# Altium schematic symbol library Capacitor - Aluminium TH.SchLib: 4591 symbols (part 11 of 27)
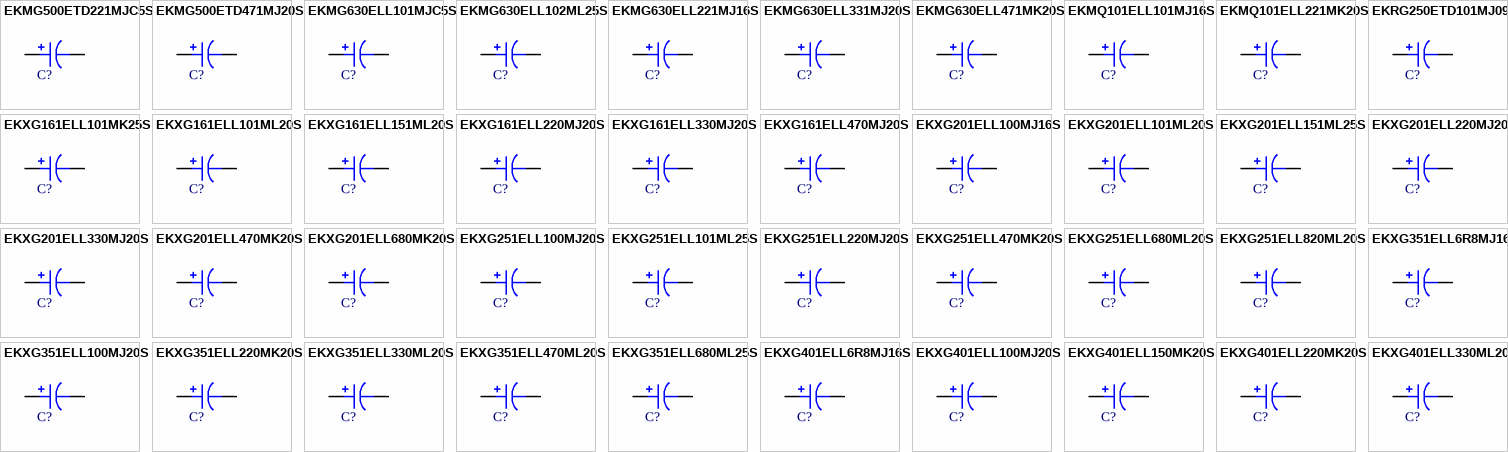
[diagram p124: symbols EKMG500ETD221MJC5S to EKXG401ELL330ML20S]

## EKXG351ELL100MJ20S
designator C?, comment 10uF  (value not drawn)
CAP ALUM 10UF 20% 350V RADIAL; Part Number: EKXG351ELL100MJ20S; Manufacturer: United Chemi-Con; TemperatureRange: -40C ~ 105C; Type: Polar; Ripple Current: 140mA @ 120Hz; Value: 10uF; PartId: 25682; Supplier 1: Digi-Key; Supplier Part Number 1: 565-1450-ND; ComponentLink1Description: Datasheet; ComponentLink1URL: http://www.chemi-con.co.jp/cgi-bin/CAT_DB/SEARCH/cat_db_al.cgi?e=e&j=p&pdfname=kxg; ComponentLink2Description: Digi-Key Listing; ComponentLink2URL: https://www.digikey.com/product-detail/en/united-chemi-con/EKXG351ELL100MJ20S/565-1450-ND/755966; Tolerance: 20%; Voltage: 350V; Price: 0.8; Device Package: Radial, Can, 10mm
footprint CAP AL TH D10 L5 H22
pins: 1, 2

## EKXG351ELL220MK20S
designator C?, comment 22uF  (value not drawn)
CAP ALUM 22UF 20% 350V RADIAL; Part Number: EKXG351ELL220MK20S; Manufacturer: United Chemi-Con; TemperatureRange: -40C ~ 105C; Type: Polar; Ripple Current: 260mA @ 120Hz; Value: 22uF; PartId: 22938; Supplier 1: Digi-Key; Supplier Part Number 1: 565-1451-ND; ComponentLink1Description: Datasheet; ComponentLink1URL: http://www.chemi-con.co.jp/cgi-bin/CAT_DB/SEARCH/cat_db_al.cgi?e=e&j=p&pdfname=kxg; ComponentLink2Description: Digi-Key Listing; ComponentLink2URL: https://www.digikey.com/product-detail/en/united-chemi-con/EKXG351ELL220MK20S/565-1451-ND/755967; Tolerance: 20%; Voltage: 350V; Price: 0; Device Package: Radial, Can, 12.5mm
footprint CAP AL TH D12.5 L5 H20
pins: 1, 2

## EKXG351ELL330ML20S
designator C?, comment 33uF  (value not drawn)
CAP ALUM 33UF 20% 350V RADIAL; Part Number: EKXG351ELL330ML20S; Manufacturer: United Chemi-Con; TemperatureRange: -40C ~ 105C; Type: Polar; Ripple Current: 360mA @ 120Hz; Value: 33uF; PartId: 26344; Supplier 1: Digi-Key; Supplier Part Number 1: 565-1452-ND; ComponentLink1Description: Datasheet; ComponentLink1URL: http://www.chemi-con.co.jp/cgi-bin/CAT_DB/SEARCH/cat_db_al.cgi?e=e&j=p&pdfname=kxg; ComponentLink2Description: Digi-Key Listing; ComponentLink2URL: https://www.digikey.com/product-detail/en/united-chemi-con/EKXG351ELL330ML20S/565-1452-ND/755968; Tolerance: 20%; Voltage: 350V; Price: 1.66; Device Package: Radial, Can, 16mm
footprint CAP AL TH D16 L7.5 H20
pins: 1, 2

## EKXG351ELL470ML20S
designator C?, comment 47uF  (value not drawn)
CAP ALUM 47UF 20% 350V RADIAL; Part Number: EKXG351ELL470ML20S; Manufacturer: United Chemi-Con; TemperatureRange: -40C ~ 105C; Type: Polar; Ripple Current: 430mA @ 120Hz; Value: 47uF; PartId: 26346; Supplier 1: Digi-Key; Supplier Part Number 1: 565-1453-ND; ComponentLink1Description: Datasheet; ComponentLink1URL: http://www.chemi-con.co.jp/cgi-bin/CAT_DB/SEARCH/cat_db_al.cgi?e=e&j=p&pdfname=kxg; ComponentLink2Description: Digi-Key Listing; ComponentLink2URL: https://www.digikey.com/product-detail/en/united-chemi-con/EKXG351ELL470ML20S/565-1453-ND/755969; Tolerance: 20%; Voltage: 350V; Price: 1.78; Device Package: Radial, Can, 16mm
footprint CAP AL TH D16 L7.5 H20
pins: 1, 2

## EKXG351ELL680ML25S
designator C?, comment 68uF  (value not drawn)
CAP ALUM 68UF 20% 350V RADIAL; Part Number: EKXG351ELL680ML25S; Manufacturer: United Chemi-Con; TemperatureRange: -40C ~ 105C; Type: Polar; Ripple Current: 560mA @ 120Hz; Value: 68uF; PartId: 26700; Supplier 1: Digi-Key; Supplier Part Number 1: 565-1454-ND; ComponentLink1Description: Datasheet; ComponentLink1URL: http://www.chemi-con.co.jp/cgi-bin/CAT_DB/SEARCH/cat_db_al.cgi?e=e&j=p&pdfname=kxg; ComponentLink2Description: Digi-Key Listing; ComponentLink2URL: https://www.digikey.com/product-detail/en/united-chemi-con/EKXG351ELL680ML25S/565-1454-ND/755970; Tolerance: 20%; Voltage: 350V; Price: 1.97; Device Package: Radial, Can, 16mm
footprint CAP AL TH D16 L7.5 H26.5
pins: 1, 2

## EKXG401ELL6R8MJ16S
designator C?, comment 6.8uF  (value not drawn)
CAP ALUM 6.8UF 20% 400V RADIAL; Part Number: EKXG401ELL6R8MJ16S; Manufacturer: United Chemi-Con; TemperatureRange: -40C ~ 105C; Type: Polar; Ripple Current: 110mA @ 120Hz; Value: 6.8uF; PartId: 25360; Supplier 1: Digi-Key; Supplier Part Number 1: 565-1460-ND; ComponentLink1Description: Datasheet; ComponentLink1URL: http://www.chemi-con.co.jp/cgi-bin/CAT_DB/SEARCH/cat_db_al.cgi?e=e&j=p&pdfname=kxg; ComponentLink2Description: Digi-Key Listing; ComponentLink2URL: https://www.digikey.com/product-detail/en/united-chemi-con/EKXG401ELL6R8MJ16S/565-1460-ND/755976; Tolerance: 20%; Voltage: 400V; Price: 0.71; Device Package: Radial, Can, 10mm
footprint CAP AL TH D10 L5 H17.5
pins: 1, 2

## EKXG401ELL100MJ20S
designator C?, comment 10uF  (value not drawn)
CAP ALUM 10UF 20% 400V RADIAL; Part Number: EKXG401ELL100MJ20S; Manufacturer: United Chemi-Con; TemperatureRange: -40C ~ 105C; Type: Polar; Ripple Current: 140mA @ 120Hz; Value: 10uF; PartId: 25695; Supplier 1: Digi-Key; Supplier Part Number 1: 565-1461-ND; ComponentLink1Description: Datasheet; ComponentLink1URL: http://www.chemi-con.co.jp/cgi-bin/CAT_DB/SEARCH/cat_db_al.cgi?e=e&j=p&pdfname=kxg; ComponentLink2Description: Digi-Key Listing; ComponentLink2URL: https://www.digikey.com/product-detail/en/united-chemi-con/EKXG401ELL100MJ20S/565-1461-ND/755977; Tolerance: 20%; Voltage: 400V; Price: 0.83; Device Package: Radial, Can, 10mm
footprint CAP AL TH D10 L5 H22
pins: 1, 2

## EKXG401ELL150MK20S
designator C?, comment 15uF  (value not drawn)
CAP ALUM 15UF 20% 400V RADIAL; Part Number: EKXG401ELL150MK20S; Manufacturer: United Chemi-Con; TemperatureRange: -40C ~ 105C; Type: Polar; Ripple Current: 220mA @ 120Hz; Value: 15uF; PartId: 22941; Supplier 1: Digi-Key; Supplier Part Number 1: 565-1462-ND; ComponentLink1Description: Datasheet; ComponentLink1URL: http://www.chemi-con.co.jp/cgi-bin/CAT_DB/SEARCH/cat_db_al.cgi?e=e&j=p&pdfname=kxg; ComponentLink2Description: Digi-Key Listing; ComponentLink2URL: https://www.digikey.com/product-detail/en/united-chemi-con/EKXG401ELL150MK20S/565-1462-ND/755978; Tolerance: 20%; Voltage: 400V; Price: 0; Device Package: Radial, Can, 12.5mm
footprint CAP AL TH D12.5 L5 H20
pins: 1, 2

## EKXG401ELL220MK20S
designator C?, comment 22uF  (value not drawn)
CAP ALUM 22UF 20% 400V RADIAL; Part Number: EKXG401ELL220MK20S; Manufacturer: United Chemi-Con; TemperatureRange: -40C ~ 105C; Type: Polar; Ripple Current: 260mA @ 120Hz; Value: 22uF; PartId: 22940; Supplier 1: Digi-Key; Supplier Part Number 1: 565-1463-ND; ComponentLink1Description: Datasheet; ComponentLink1URL: http://www.chemi-con.co.jp/cgi-bin/CAT_DB/SEARCH/cat_db_al.cgi?e=e&j=p&pdfname=kxg; ComponentLink2Description: Digi-Key Listing; ComponentLink2URL: https://www.digikey.com/product-detail/en/united-chemi-con/EKXG401ELL220MK20S/565-1463-ND/755979; Tolerance: 20%; Voltage: 400V; Price: 0; Device Package: Radial, Can, 12.5mm
footprint CAP AL TH D12.5 L5 H20
pins: 1, 2

## EKXG401ELL330ML20S
designator C?, comment 33uF  (value not drawn)
CAP ALUM 33UF 20% 400V RADIAL; Part Number: EKXG401ELL330ML20S; Manufacturer: United Chemi-Con; TemperatureRange: -40C ~ 105C; Type: Polar; Ripple Current: 360mA @ 120Hz; Value: 33uF; PartId: 26341; Supplier 1: Digi-Key; Supplier Part Number 1: 565-1464-ND; ComponentLink1Description: Datasheet; ComponentLink1URL: http://www.chemi-con.co.jp/cgi-bin/CAT_DB/SEARCH/cat_db_al.cgi?e=e&j=p&pdfname=kxg; ComponentLink2Description: Digi-Key Listing; ComponentLink2URL: https://www.digikey.com/product-detail/en/united-chemi-con/EKXG401ELL330ML20S/565-1464-ND/755980; Tolerance: 20%; Voltage: 400V; Price: 1.62; Device Package: Radial, Can, 16mm
footprint CAP AL TH D16 L7.5 H20
pins: 1, 2

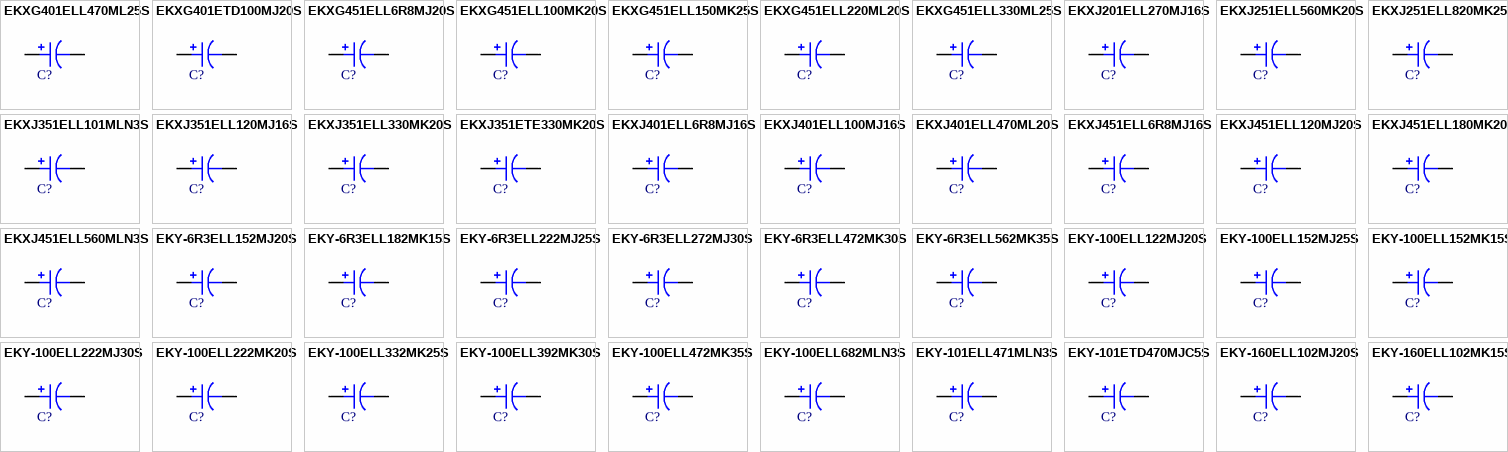
[diagram p43: symbols EKXG401ELL470ML25S to EKY-160ELL102MK15S]

## EKXG401ELL470ML25S
designator C?, comment 47uF  (value not drawn)
CAP ALUM 47UF 20% 400V RADIAL; Part Number: EKXG401ELL470ML25S; Manufacturer: United Chemi-Con; TemperatureRange: -40C ~ 105C; Type: Polar; Ripple Current: 470mA @ 120Hz; Value: 47uF; PartId: 26699; Supplier 1: Digi-Key; Supplier Part Number 1: 565-1465-ND; ComponentLink1Description: Datasheet; ComponentLink1URL: http://www.chemi-con.co.jp/cgi-bin/CAT_DB/SEARCH/cat_db_al.cgi?e=e&j=p&pdfname=kxg; ComponentLink2Description: Digi-Key Listing; ComponentLink2URL: https://www.digikey.com/product-detail/en/united-chemi-con/EKXG401ELL470ML25S/565-1465-ND/755981; Tolerance: 20%; Voltage: 400V; Price: 1.96; Device Package: Radial, Can, 16mm
footprint CAP AL TH D16 L7.5 H26.5
pins: 1, 2

## EKXG401ETD100MJ20S
designator C?, comment 10uF  (value not drawn)
CAP ALUM 10UF 20% 400V RADIAL; Part Number: EKXG401ETD100MJ20S; Manufacturer: United Chemi-Con; TemperatureRange: -40C ~ 105C; Type: Polar; Ripple Current: 140mA @ 120Hz; Value: 10uF; PartId: 25471; Supplier 1: Digi-Key; Supplier Part Number 1: 565-4257-3-ND; ComponentLink1Description: Datasheet; ComponentLink1URL: http://www.chemi-con.co.jp/cgi-bin/CAT_DB/SEARCH/cat_db_al.cgi?e=e&j=p&pdfname=kxg; ComponentLink2Description: Digi-Key Listing; ComponentLink2URL: https://www.digikey.com/product-detail/en/united-chemi-con/EKXG401ETD100MJ20S/565-4257-3-ND/4001214; Tolerance: 20%; Voltage: 400V; Price: 0.2907; Device Package: Radial, Can, 10mm
footprint CAP AL TH D10 L5 H22
pins: 1, 2

## EKXG451ELL6R8MJ20S
designator C?, comment 6.8uF  (value not drawn)
CAP ALUM 6.8UF 20% 450V RADIAL; Part Number: EKXG451ELL6R8MJ20S; Manufacturer: United Chemi-Con; TemperatureRange: -25C ~ 105C; Type: Polar; Ripple Current: 110mA @ 120Hz; Value: 6.8uF; PartId: 25679; Supplier 1: Digi-Key; Supplier Part Number 1: 565-1472-ND; ComponentLink1Description: Datasheet; ComponentLink1URL: http://www.chemi-con.co.jp/cgi-bin/CAT_DB/SEARCH/cat_db_al.cgi?e=e&j=p&pdfname=kxg; ComponentLink2Description: Digi-Key Listing; ComponentLink2URL: https://www.digikey.com/product-detail/en/united-chemi-con/EKXG451ELL6R8MJ20S/565-1472-ND/755988; Tolerance: 20%; Voltage: 450V; Price: 0.8; Device Package: Radial, Can, 10mm
footprint CAP AL TH D10 L5 H22
pins: 1, 2

## EKXG451ELL100MK20S
designator C?, comment 10uF  (value not drawn)
CAP ALUM 10UF 20% 450V RADIAL; Part Number: EKXG451ELL100MK20S; Manufacturer: United Chemi-Con; TemperatureRange: -25C ~ 105C; Type: Polar; Ripple Current: 180mA @ 120Hz; Value: 10uF; PartId: 22939; Supplier 1: Digi-Key; Supplier Part Number 1: 565-1473-ND; ComponentLink1Description: Datasheet; ComponentLink1URL: http://www.chemi-con.co.jp/cgi-bin/CAT_DB/SEARCH/cat_db_al.cgi?e=e&j=p&pdfname=kxg; ComponentLink2Description: Digi-Key Listing; ComponentLink2URL: https://www.digikey.com/product-detail/en/united-chemi-con/EKXG451ELL100MK20S/565-1473-ND/755989; Tolerance: 20%; Voltage: 450V; Price: 0; Device Package: Radial, Can, 12.5mm
footprint CAP AL TH D12.5 L5 H20
pins: 1, 2

## EKXG451ELL150MK25S
designator C?, comment 15uF  (value not drawn)
CAP ALUM 15UF 20% 450V RADIAL; Part Number: EKXG451ELL150MK25S; Manufacturer: United Chemi-Con; TemperatureRange: -25C ~ 105C; Type: Polar; Ripple Current: 240mA @ 120Hz; Value: 15uF; PartId: 23621; Supplier 1: Digi-Key; Supplier Part Number 1: 565-1474-ND; ComponentLink1Description: Datasheet; ComponentLink1URL: http://www.chemi-con.co.jp/cgi-bin/CAT_DB/SEARCH/cat_db_al.cgi?e=e&j=p&pdfname=kxg; ComponentLink2Description: Digi-Key Listing; ComponentLink2URL: https://www.digikey.com/product-detail/en/united-chemi-con/EKXG451ELL150MK25S/565-1474-ND/755990; Tolerance: 20%; Voltage: 450V; Price: 1.45; Device Package: Radial, Can, 12.5mm
footprint CAP AL TH D12.5 L5 H25
pins: 1, 2

## EKXG451ELL220ML20S
designator C?, comment 22uF  (value not drawn)
CAP ALUM 22UF 20% 450V RADIAL; Part Number: EKXG451ELL220ML20S; Manufacturer: United Chemi-Con; TemperatureRange: -25C ~ 105C; Type: Polar; Ripple Current: 290mA @ 120Hz; Value: 22uF; PartId: 26345; Supplier 1: Digi-Key; Supplier Part Number 1: 565-1475-ND; ComponentLink1Description: Datasheet; ComponentLink1URL: http://www.chemi-con.co.jp/cgi-bin/CAT_DB/SEARCH/cat_db_al.cgi?e=e&j=p&pdfname=kxg; ComponentLink2Description: Digi-Key Listing; ComponentLink2URL: https://www.digikey.com/product-detail/en/united-chemi-con/EKXG451ELL220ML20S/565-1475-ND/755991; Tolerance: 20%; Voltage: 450V; Price: 1.75; Device Package: Radial, Can, 16mm
footprint CAP AL TH D16 L7.5 H20
pins: 1, 2

## EKXG451ELL330ML25S
designator C?, comment 33uF  (value not drawn)
CAP ALUM 33UF 20% 450V RADIAL; Part Number: EKXG451ELL330ML25S; Manufacturer: United Chemi-Con; TemperatureRange: -25C ~ 105C; Type: Polar; Ripple Current: 390mA @ 120Hz; Value: 33uF; PartId: 26704; Supplier 1: Digi-Key; Supplier Part Number 1: 565-1476-ND; ComponentLink1Description: Datasheet; ComponentLink1URL: http://www.chemi-con.co.jp/cgi-bin/CAT_DB/SEARCH/cat_db_al.cgi?e=e&j=p&pdfname=kxg; ComponentLink2Description: Digi-Key Listing; ComponentLink2URL: https://www.digikey.com/product-detail/en/united-chemi-con/EKXG451ELL330ML25S/565-1476-ND/755992; Tolerance: 20%; Voltage: 450V; Price: 2.19; Device Package: Radial, Can, 16mm
footprint CAP AL TH D16 L7.5 H26.5
pins: 1, 2

## EKXJ201ELL270MJ16S
designator C?, comment 27uF  (value not drawn)
CAP ALUM 27UF 20% 200V RADIAL; Part Number: EKXJ201ELL270MJ16S; Manufacturer: United Chemi-Con; TemperatureRange: -40C ~ 105C; Type: Polar; Ripple Current: 200mA @ 120Hz; Value: 27uF; PartId: 25395; Supplier 1: Digi-Key; Supplier Part Number 1: 565-4217-ND; ComponentLink1Description: Datasheet; ComponentLink1URL: http://www.chemi-con.co.jp/cgi-bin/CAT_DB/SEARCH/cat_db_al.cgi?e=e&j=p&pdfname=kxj; ComponentLink2Description: Digi-Key Listing; ComponentLink2URL: https://www.digikey.com/product-detail/en/united-chemi-con/EKXJ201ELL270MJ16S/565-4217-ND/4001231; Tolerance: 20%; Voltage: 200V; Price: 0.79; Device Package: Radial, Can, 10mm
footprint CAP AL TH D10 L5 H17.5
pins: 1, 2

## EKXJ251ELL560MK20S
designator C?, comment 56uF  (value not drawn)
CAP ALUM 56UF 20% 250V RADIAL; Part Number: EKXJ251ELL560MK20S; Manufacturer: United Chemi-Con; TemperatureRange: -40C ~ 105C; Type: Polar; Ripple Current: 430mA @ 120Hz; Value: 56uF; PartId: 23042; Supplier 1: Digi-Key; Supplier Part Number 1: 565-3497-ND; ComponentLink1Description: Datasheet; ComponentLink1URL: http://www.chemi-con.co.jp/cgi-bin/CAT_DB/SEARCH/cat_db_al.cgi?e=e&j=p&pdfname=kxj; ComponentLink2Description: Digi-Key Listing; ComponentLink2URL: https://www.digikey.com/product-detail/en/united-chemi-con/EKXJ251ELL560MK20S/565-3497-ND/3529014; Tolerance: 20%; Voltage: 250V; Price: 0; Device Package: Radial, Can, 12.5mm
footprint CAP AL TH D12.5 L5 H21.5
pins: 1, 2

## EKXJ251ELL820MK25S
designator C?, comment 82uF  (value not drawn)
CAP ALUM 82UF 20% 250V RADIAL; Part Number: EKXJ251ELL820MK25S; Manufacturer: United Chemi-Con; TemperatureRange: -40C ~ 105C; Type: Polar; Ripple Current: 565mA @ 120Hz; Value: 82uF; PartId: 23735; Supplier 1: Digi-Key; Supplier Part Number 1: 565-3498-ND; ComponentLink1Description: Datasheet; ComponentLink1URL: http://www.chemi-con.co.jp/cgi-bin/CAT_DB/SEARCH/cat_db_al.cgi?e=e&j=p&pdfname=kxj; ComponentLink2Description: Digi-Key Listing; ComponentLink2URL: https://www.digikey.com/product-detail/en/united-chemi-con/EKXJ251ELL820MK25S/565-3498-ND/3529020; Tolerance: 20%; Voltage: 250V; Price: 1.5; Device Package: Radial, Can, 12.5mm
footprint CAP AL TH D12.5 L5 H26.5
pins: 1, 2

## EKXJ351ELL101MLN3S
designator C?, comment 100uF  (value not drawn)
CAP ALUM 100UF 20% 350V RADIAL; Part Number: EKXJ351ELL101MLN3S; Manufacturer: United Chemi-Con; TemperatureRange: -40C ~ 105C; Type: Polar; Ripple Current: 740mA @ 120Hz; Value: 100uF; PartId: 27262; Supplier 1: Digi-Key; Supplier Part Number 1: 565-3509-ND; ComponentLink1Description: Datasheet; ComponentLink1URL: http://www.chemi-con.co.jp/cgi-bin/CAT_DB/SEARCH/cat_db_al.cgi?e=e&j=p&pdfname=kxj; ComponentLink2Description: Digi-Key Listing; ComponentLink2URL: https://www.digikey.com/product-detail/en/united-chemi-con/EKXJ351ELL101MLN3S/565-3509-ND/3529022; Tolerance: 20%; Voltage: 350V; Price: 2.86; Device Package: Radial, Can, 16mm
footprint CAP AL TH D16 L7.5 H33.5
pins: 1, 2

## EKXJ351ELL120MJ16S
designator C?, comment 12uF  (value not drawn)
CAP ALUM 12UF 20% 350V RADIAL; Part Number: EKXJ351ELL120MJ16S; Manufacturer: United Chemi-Con; TemperatureRange: -40C ~ 105C; Type: Polar; Ripple Current: 135mA @ 120Hz; Value: 12uF; PartId: 25396; Supplier 1: Digi-Key; Supplier Part Number 1: 565-3506-ND; ComponentLink1Description: Datasheet; ComponentLink1URL: http://www.chemi-con.co.jp/cgi-bin/CAT_DB/SEARCH/cat_db_al.cgi?e=e&j=p&pdfname=kxj; ComponentLink2Description: Digi-Key Listing; ComponentLink2URL: https://www.digikey.com/product-detail/en/united-chemi-con/EKXJ351ELL120MJ16S/565-3506-ND/3529024; Tolerance: 20%; Voltage: 350V; Price: 0.79; Device Package: Radial, Can, 10mm
footprint CAP AL TH D10 L5 H17.5
pins: 1, 2

## EKXJ351ELL330MK20S
designator C?, comment 33uF  (value not drawn)
CAP ALUM 33UF 20% 350V RADIAL; Part Number: EKXJ351ELL330MK20S; Manufacturer: United Chemi-Con; TemperatureRange: -40C ~ 105C; Type: Polar; Ripple Current: 330mA @ 120Hz; Value: 33uF; PartId: 23049; Supplier 1: Digi-Key; Supplier Part Number 1: 565-4220-ND; ComponentLink1Description: Datasheet; ComponentLink1URL: http://www.chemi-con.co.jp/cgi-bin/CAT_DB/SEARCH/cat_db_al.cgi?e=e&j=p&pdfname=kxj; ComponentLink2Description: Digi-Key Listing; ComponentLink2URL: https://www.digikey.com/product-detail/en/united-chemi-con/EKXJ351ELL330MK20S/565-4220-ND/4001256; Tolerance: 20%; Voltage: 350V; Price: 0; Device Package: Radial, Can, 12.5mm
footprint CAP AL TH D12.5 L5 H21.5
pins: 1, 2

## EKXJ351ETE330MK20S
designator C?, comment 33uF  (value not drawn)
CAP ALUM 33UF 20% 350V RADIAL; Part Number: EKXJ351ETE330MK20S; Manufacturer: United Chemi-Con; TemperatureRange: -40C ~ 105C; Type: Polar; Ripple Current: 330mA @ 120Hz; Value: 33uF; PartId: 23058; Supplier 1: Digi-Key; Supplier Part Number 1: 565-3345-1-ND; ComponentLink1Description: Datasheet; ComponentLink1URL: http://www.chemi-con.co.jp/cgi-bin/CAT_DB/SEARCH/cat_db_al.cgi?e=e&j=p&pdfname=kxj; ComponentLink2Description: Digi-Key Listing; ComponentLink2URL: https://www.digikey.com/product-detail/en/united-chemi-con/EKXJ351ETE330MK20S/565-3345-1-ND/3504608; Tolerance: 20%; Voltage: 350V; Price: 0; Device Package: Radial, Can, 12.5mm
footprint CAP AL TH D12.5 L5 H21.5
pins: 1, 2

## EKXJ401ELL6R8MJ16S
designator C?, comment 6.8uF  (value not drawn)
CAP ALUM 6.8UF 20% 400V RADIAL; Part Number: EKXJ401ELL6R8MJ16S; Manufacturer: United Chemi-Con; TemperatureRange: -40C ~ 105C; Type: Polar; Value: 6.8uF; PartId: 25392; Supplier 1: Digi-Key; Supplier Part Number 1: 565-3517-ND; ComponentLink1Description: Datasheet; ComponentLink1URL: http://www.chemi-con.co.jp/cgi-bin/CAT_DB/SEARCH/cat_db_al.cgi?e=e&j=p&pdfname=kxj; ComponentLink2Description: Digi-Key Listing; ComponentLink2URL: https://www.digikey.com/product-detail/en/united-chemi-con/EKXJ401ELL6R8MJ16S/565-3517-ND/3529073; Tolerance: 20%; Voltage: 400V; Price: 0.78; Device Package: Radial, Can, 10mm
footprint CAP AL TH D10 L5 H17.5
pins: 1, 2

## EKXJ401ELL100MJ16S
designator C?, comment 10uF  (value not drawn)
CAP ALUM 10UF 20% 400V RADIAL; Part Number: EKXJ401ELL100MJ16S; Manufacturer: United Chemi-Con; TemperatureRange: -40C ~ 105C; Type: Polar; Ripple Current: 125mA @ 120Hz; Value: 10uF; PartId: 25407; Supplier 1: Digi-Key; Supplier Part Number 1: 565-4221-ND; ComponentLink1Description: Datasheet; ComponentLink1URL: http://www.chemi-con.co.jp/cgi-bin/CAT_DB/SEARCH/cat_db_al.cgi?e=e&j=p&pdfname=kxj; ComponentLink2Description: Digi-Key Listing; ComponentLink2URL: https://www.digikey.com/product-detail/en/united-chemi-con/EKXJ401ELL100MJ16S/565-4221-ND/4001263; Tolerance: 20%; Voltage: 400V; Price: 0.83; Device Package: Radial, Can, 10mm
footprint CAP AL TH D10 L5 H17.5
pins: 1, 2

## EKXJ401ELL470ML20S
designator C?, comment 47uF  (value not drawn)
CAP ALUM 47UF 20% 400V RADIAL; Part Number: EKXJ401ELL470ML20S; Manufacturer: United Chemi-Con; TemperatureRange: -40C ~ 105C; Type: Polar; Ripple Current: 435mA @ 120Hz; Value: 47uF; PartId: 26492; Supplier 1: Digi-Key; Supplier Part Number 1: 565-3521-ND; ComponentLink1Description: Datasheet; ComponentLink1URL: http://www.chemi-con.co.jp/cgi-bin/CAT_DB/SEARCH/cat_db_al.cgi?e=e&j=p&pdfname=kxj; ComponentLink2Description: Digi-Key Listing; ComponentLink2URL: https://www.digikey.com/product-detail/en/united-chemi-con/EKXJ401ELL470ML20S/565-3521-ND/3529067; Tolerance: 20%; Voltage: 400V; Price: 1.89; Device Package: Radial, Can, 16mm
footprint CAP AL TH D16 L7.5 H22
pins: 1, 2

## EKXJ451ELL6R8MJ16S
designator C?, comment 6.8uF  (value not drawn)
CAP ALUM 6.8UF 20% 450V RADIAL; Part Number: EKXJ451ELL6R8MJ16S; Manufacturer: United Chemi-Con; TemperatureRange: -25C ~ 105C; Type: Polar; Ripple Current: 105mA @ 120Hz; Value: 6.8uF; PartId: 25410; Supplier 1: Digi-Key; Supplier Part Number 1: 565-4229-ND; ComponentLink1Description: Datasheet; ComponentLink1URL: http://www.chemi-con.co.jp/cgi-bin/CAT_DB/SEARCH/cat_db_al.cgi?e=e&j=p&pdfname=kxj; ComponentLink2Description: Digi-Key Listing; ComponentLink2URL: https://www.digikey.com/product-detail/en/united-chemi-con/EKXJ451ELL6R8MJ16S/565-4229-ND/4001285; Tolerance: 20%; Voltage: 450V; Price: 0.83; Device Package: Radial, Can, 10mm
footprint CAP AL TH D10 L5 H17.5
pins: 1, 2

## EKXJ451ELL120MJ20S
designator C?, comment 12uF  (value not drawn)
CAP ALUM 12UF 20% 450V RADIAL; Part Number: EKXJ451ELL120MJ20S; Manufacturer: United Chemi-Con; TemperatureRange: -25C ~ 105C; Type: Polar; Ripple Current: 150mA @ 120Hz; Value: 12uF; PartId: 25704; Supplier 1: Digi-Key; Supplier Part Number 1: 565-4225-ND; ComponentLink1Description: Datasheet; ComponentLink1URL: http://www.chemi-con.co.jp/cgi-bin/CAT_DB/SEARCH/cat_db_al.cgi?e=e&j=p&pdfname=kxj; ComponentLink2Description: Digi-Key Listing; ComponentLink2URL: https://www.digikey.com/product-detail/en/united-chemi-con/EKXJ451ELL120MJ20S/565-4225-ND/3529113; Tolerance: 20%; Voltage: 450V; Price: 0.91; Device Package: Radial, Can, 10mm
footprint CAP AL TH D10 L5 H22
pins: 1, 2

## EKXJ451ELL180MK20S
designator C?, comment 18uF  (value not drawn)
CAP ALUM 18UF 20% 450V RADIAL; Part Number: EKXJ451ELL180MK20S; Manufacturer: United Chemi-Con; TemperatureRange: -25C ~ 105C; Type: Polar; Ripple Current: 255mA @ 120Hz; Value: 18uF; PartId: 23045; Supplier 1: Digi-Key; Supplier Part Number 1: 565-3528-ND; ComponentLink1Description: Datasheet; ComponentLink1URL: http://www.chemi-con.co.jp/cgi-bin/CAT_DB/SEARCH/cat_db_al.cgi?e=e&j=p&pdfname=kxj; ComponentLink2Description: Digi-Key Listing; ComponentLink2URL: https://www.digikey.com/product-detail/en/united-chemi-con/EKXJ451ELL180MK20S/565-3528-ND/3529116; Tolerance: 20%; Voltage: 450V; Price: 0; Device Package: Radial, Can, 12.5mm
footprint CAP AL TH D12.5 L5 H21.5
pins: 1, 2

## EKXJ451ELL560MLN3S
designator C?, comment 56uF  (value not drawn)
CAP ALUM 56UF 20% 450V RADIAL; Part Number: EKXJ451ELL560MLN3S; Manufacturer: United Chemi-Con; TemperatureRange: -25C ~ 105C; Type: Polar; Ripple Current: 585mA @ 120Hz; Value: 56uF; PartId: 27249; Supplier 1: Digi-Key; Supplier Part Number 1: 565-3538-ND; ComponentLink1Description: Datasheet; ComponentLink1URL: http://www.chemi-con.co.jp/cgi-bin/CAT_DB/SEARCH/cat_db_al.cgi?e=e&j=p&pdfname=kxj; ComponentLink2Description: Digi-Key Listing; ComponentLink2URL: https://www.digikey.com/product-detail/en/united-chemi-con/EKXJ451ELL560MLN3S/565-3538-ND/3529129; Tolerance: 20%; Voltage: 450V; Price: 2.65; Device Package: Radial, Can, 16mm
footprint CAP AL TH D16 L7.5 H33.5
pins: 1, 2

## EKY-6R3ELL152MJ20S
designator C?, comment 1500uF  (value not drawn)
CAP ALUM 1500UF 20% 6.3V RADIAL; Part Number: EKY-6R3ELL152MJ20S; Manufacturer: United Chemi-Con; TemperatureRange: -40C ~ 105C; Type: Polar; Ripple Current: 840mA @ 120Hz; Impedance: 46 mOhm; Value: 1500uF; PartId: 25515; Supplier 1: Digi-Key; Supplier Part Number 1: 565-1489-ND; ComponentLink1Description: Datasheet; ComponentLink1URL: http://www.chemi-con.co.jp/cgi-bin/CAT_DB/SEARCH/cat_db_al.cgi?e=e&j=p&pdfname=ky; ComponentLink2Description: Digi-Key Listing; ComponentLink2URL: https://www.digikey.com/product-detail/en/united-chemi-con/EKY-6R3ELL152MJ20S/565-1489-ND/756005; Tolerance: 20%; Voltage: 6.3V; Price: 0.57; Device Package: Radial, Can, 10mm
footprint CAP AL TH D10 L5 H22
pins: 1, 2

## EKY-6R3ELL182MK15S
designator C?, comment 1800uF  (value not drawn)
CAP ALUM 1800UF 20% 6.3V RADIAL; Part Number: EKY-6R3ELL182MK15S; Manufacturer: United Chemi-Con; TemperatureRange: -40C ~ 105C; Type: Polar; Ripple Current: 870mA @ 120Hz; Impedance: 49 mOhm; Value: 1800uF; PartId: 22711; Supplier 1: Digi-Key; Supplier Part Number 1: 565-1490-ND; ComponentLink1Description: Datasheet; ComponentLink1URL: http://www.chemi-con.co.jp/cgi-bin/CAT_DB/SEARCH/cat_db_al.cgi?e=e&j=p&pdfname=ky; ComponentLink2Description: Digi-Key Listing; ComponentLink2URL: https://www.digikey.com/product-detail/en/united-chemi-con/EKY-6R3ELL182MK15S/565-1490-ND/756006; Tolerance: 20%; Voltage: 6.3V; Price: 0; Device Package: Radial, Can, 12.5mm
footprint CAP AL TH D12.5 L5 H15
pins: 1, 2

## EKY-6R3ELL222MJ25S
designator C?, comment 2200uF  (value not drawn)
CAP ALUM 2200UF 20% 6.3V RADIAL; Part Number: EKY-6R3ELL222MJ25S; Manufacturer: United Chemi-Con; TemperatureRange: -40C ~ 105C; Type: Polar; Ripple Current: 1.2375A @ 120Hz; Impedance: 42 mOhm; Value: 2200uF; PartId: 26081; Supplier 1: Digi-Key; Supplier Part Number 1: 565-1491-ND; ComponentLink1Description: Datasheet; ComponentLink1URL: http://www.chemi-con.co.jp/cgi-bin/CAT_DB/SEARCH/cat_db_al.cgi?e=e&j=p&pdfname=ky; ComponentLink2Description: Digi-Key Listing; ComponentLink2URL: https://www.digikey.com/product-detail/en/united-chemi-con/EKY-6R3ELL222MJ25S/565-1491-ND/756007; Tolerance: 20%; Voltage: 6.3V; Price: 0.71; Device Package: Radial, Can, 10mm
footprint CAP AL TH D10 L5 H30
pins: 1, 2

## EKY-6R3ELL272MJ30S
designator C?, comment 2700uF  (value not drawn)
CAP ALUM 2700UF 20% 6.3V RADIAL; Part Number: EKY-6R3ELL272MJ30S; Manufacturer: United Chemi-Con; TemperatureRange: -40C ~ 105C; Type: Polar; Ripple Current: 1.4325A @ 120Hz; Impedance: 31 mOhm; Value: 2700uF; PartId: 26052; Supplier 1: Digi-Key; Supplier Part Number 1: 565-1492-ND; ComponentLink1Description: Datasheet; ComponentLink1URL: http://www.chemi-con.co.jp/cgi-bin/CAT_DB/SEARCH/cat_db_al.cgi?e=e&j=p&pdfname=ky; ComponentLink2Description: Digi-Key Listing; ComponentLink2URL: https://www.digikey.com/product-detail/en/united-chemi-con/EKY-6R3ELL272MJ30S/565-1492-ND/756008; Tolerance: 20%; Voltage: 6.3V; Price: 0.63; Device Package: Radial, Can, 10mm
footprint CAP AL TH D10 L5 H30
pins: 1, 2

## EKY-6R3ELL472MK30S
designator C?, comment 4700uF  (value not drawn)
CAP ALUM 4700UF 20% 6.3V RADIAL; Part Number: EKY-6R3ELL472MK30S; Manufacturer: United Chemi-Con; TemperatureRange: -40C ~ 105C; Type: Polar; Ripple Current: 2.2525A @ 120Hz; Impedance: 24 mOhm; Value: 4700uF; PartId: 24213; Supplier 1: Digi-Key; Supplier Part Number 1: 565-1495-ND; ComponentLink1Description: Datasheet; ComponentLink1URL: http://www.chemi-con.co.jp/cgi-bin/CAT_DB/SEARCH/cat_db_al.cgi?e=e&j=p&pdfname=ky; ComponentLink2Description: Digi-Key Listing; ComponentLink2URL: https://www.digikey.com/product-detail/en/united-chemi-con/EKY-6R3ELL472MK30S/565-1495-ND/756011; Tolerance: 20%; Voltage: 6.3V; Price: 0.95; Device Package: Radial, Can, 12.5mm
footprint CAP AL TH D12.5 L5 H35.5
pins: 1, 2

## EKY-6R3ELL562MK35S
designator C?, comment 5600uF  (value not drawn)
CAP ALUM 5600UF 20% 6.3V RADIAL; Part Number: EKY-6R3ELL562MK35S; Manufacturer: United Chemi-Con; TemperatureRange: -40C ~ 105C; Type: Polar; Ripple Current: 2.448A @ 120Hz; Impedance: 20 mOhm; Value: 5600uF; PartId: 24256; Supplier 1: Digi-Key; Supplier Part Number 1: 565-1496-ND; ComponentLink1Description: Datasheet; ComponentLink1URL: http://www.chemi-con.co.jp/cgi-bin/CAT_DB/SEARCH/cat_db_al.cgi?e=e&j=p&pdfname=ky; ComponentLink2Description: Digi-Key Listing; ComponentLink2URL: https://www.digikey.com/product-detail/en/united-chemi-con/EKY-6R3ELL562MK35S/565-1496-ND/756012; Tolerance: 20%; Voltage: 6.3V; Price: 1.03; Device Package: Radial, Can, 12.5mm
footprint CAP AL TH D12.5 L5 H35.5
pins: 1, 2

## EKY-100ELL122MJ20S
designator C?, comment 1200uF  (value not drawn)
CAP ALUM 1200UF 20% 10V RADIAL; Part Number: EKY-100ELL122MJ20S; Manufacturer: United Chemi-Con; TemperatureRange: -40C ~ 105C; Type: Polar; Ripple Current: 840mA @ 120Hz; Impedance: 46 mOhm; Value: 1200uF; PartId: 25514; Supplier 1: Digi-Key; Supplier Part Number 1: 565-1506-ND; ComponentLink1Description: Datasheet; ComponentLink1URL: http://www.chemi-con.co.jp/cgi-bin/CAT_DB/SEARCH/cat_db_al.cgi?e=e&j=p&pdfname=ky; ComponentLink2Description: Digi-Key Listing; ComponentLink2URL: https://www.digikey.com/product-detail/en/united-chemi-con/EKY-100ELL122MJ20S/565-1506-ND/756022; Tolerance: 20%; Voltage: 10V; Price: 0.56; Device Package: Radial, Can, 10mm
footprint CAP AL TH D10 L5 H22
pins: 1, 2

## EKY-100ELL152MJ25S
designator C?, comment 1500uF  (value not drawn)
CAP ALUM 1500UF 20% 10V RADIAL; Part Number: EKY-100ELL152MJ25S; Manufacturer: United Chemi-Con; TemperatureRange: -40C ~ 105C; Type: Polar; Ripple Current: 990mA @ 120Hz; Impedance: 42 mOhm; Value: 1500uF; PartId: 26070; Supplier 1: Digi-Key; Supplier Part Number 1: 565-1507-ND; ComponentLink1Description: Datasheet; ComponentLink1URL: http://www.chemi-con.co.jp/cgi-bin/CAT_DB/SEARCH/cat_db_al.cgi?e=e&j=p&pdfname=ky; ComponentLink2Description: Digi-Key Listing; ComponentLink2URL: https://www.digikey.com/product-detail/en/united-chemi-con/EKY-100ELL152MJ25S/565-1507-ND/756023; Tolerance: 20%; Voltage: 10V; Price: 0.7; Device Package: Radial, Can, 10mm
footprint CAP AL TH D10 L5 H30
pins: 1, 2

## EKY-100ELL152MK15S
designator C?, comment 1500uF  (value not drawn)